# Altium footprint library ALL.PcbLib: 385 footprints (part 14 of 25)
Each footprint in its own frame and in the unit in brackets; x right, y up, seen from the top. Pads: shape width x height; smd on the part's side, far side on the other; paste and mask are expansions set on the pad; w line width, h text height; cw(c..) or ccw(c..) is an arc to the next point about the centre after c.
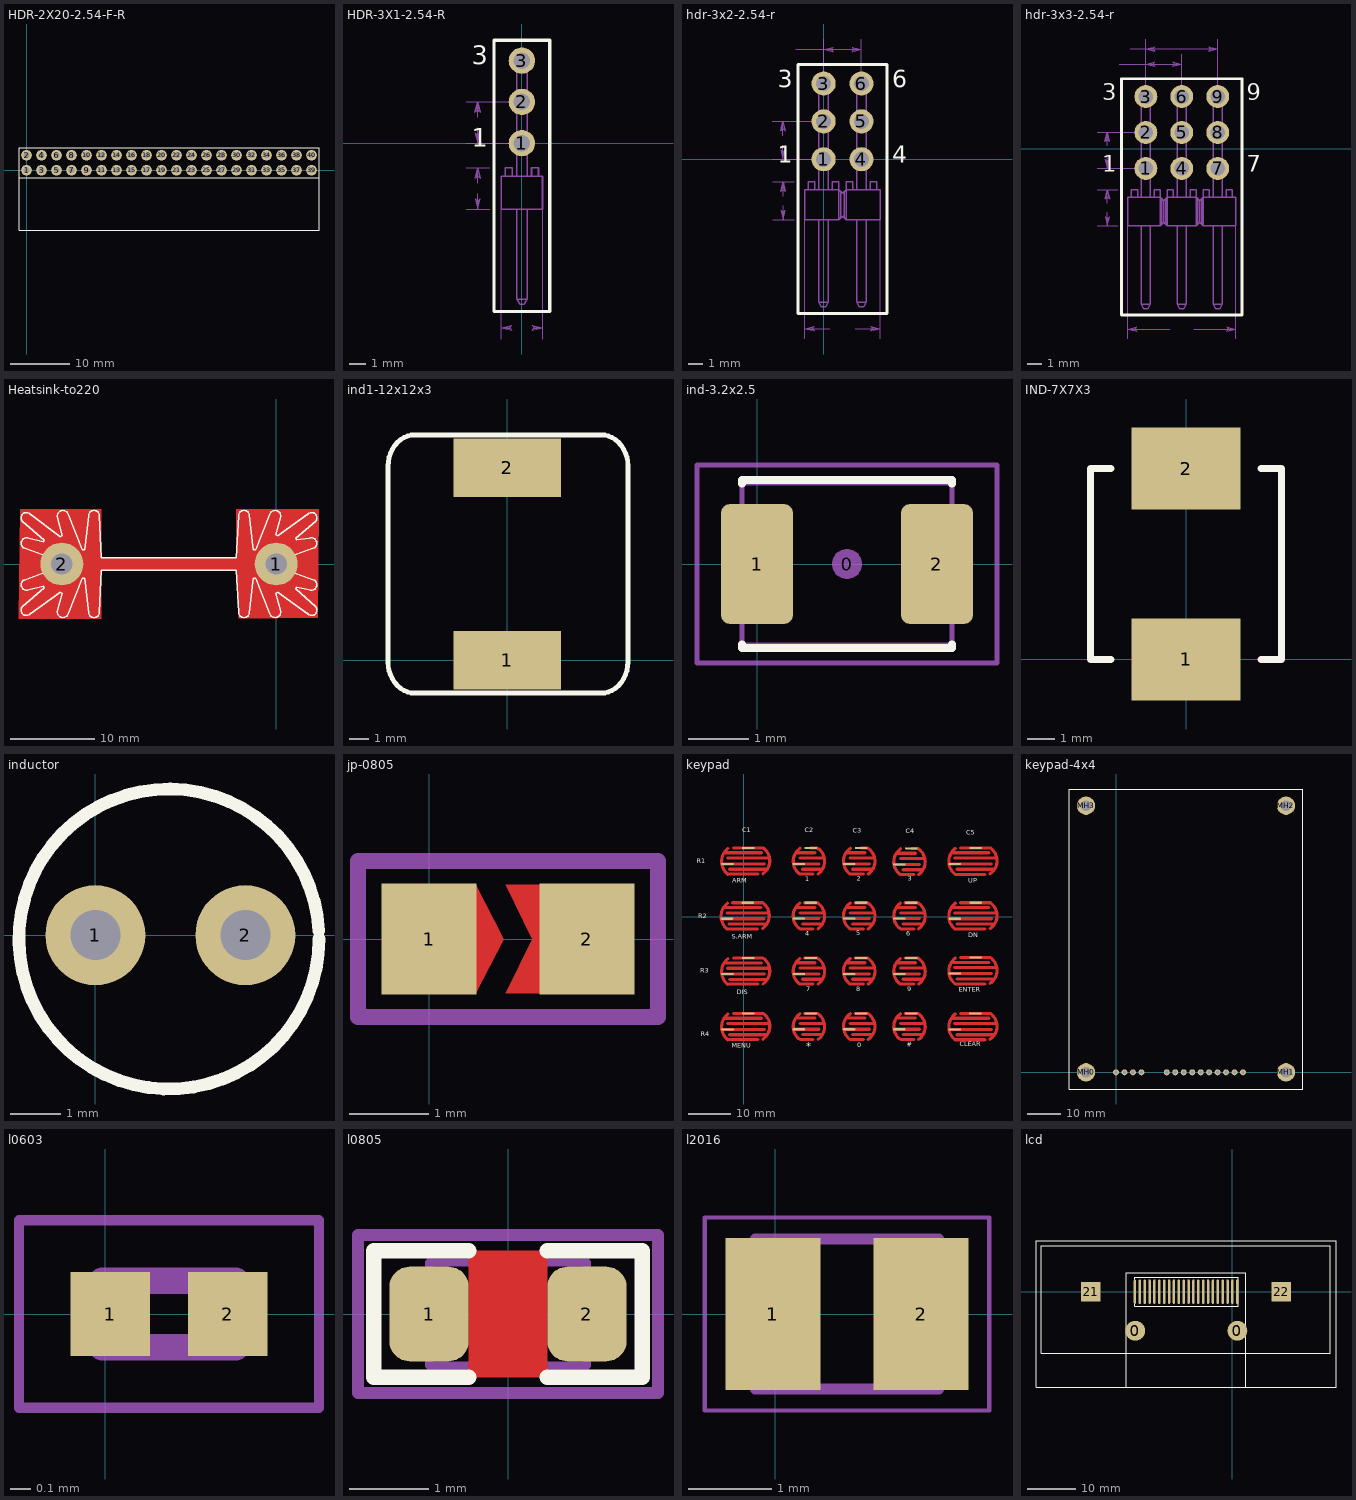
[diagram p13: the footprints below, top view; thin cyan lines are the x and y axes]

## HDR-2X20-2.54-F-R [mm]
pads (40):
  round 1.8 hole 1: 1(0,0) 2(0,2.54) 3(2.54,0) 4(2.54,2.54) 5(5.08,0) 6(5.08,2.54) 7(7.62,0) 8(7.62,2.54) 9(10.16,0) 10(10.16,2.54) 11(12.7,0) 12(12.7,2.54) 13(15.24,0) 14(15.24,2.54) 15(17.78,0) 16(17.78,2.54) 17(20.32,0) 18(20.32,2.54) 19(22.86,0) 20(22.86,2.54) 21(25.4,0) 22(25.4,2.54) 23(27.94,0) 24(27.94,2.54) 25(30.48,0) 26(30.48,2.54) 27(33.02,0) 28(33.02,2.54) 29(35.56,0) 30(35.56,2.54) 31(38.1,0) 32(38.1,2.54) 33(40.64,0) 34(40.64,2.54) 35(43.18,0) 36(43.18,2.54) 37(45.72,0) 38(45.72,2.54) 39(48.26,0) 40(48.26,2.54)
Top Overlay:
  lines w0.2: -1.27,-1.27 -1.27,3.81 49.53,3.81 49.53,-1.27 ; -1.27,-1.27 49.53,-1.27 ; -1.27,-1.27 -1.27,-10.16 49.53,-10.16 49.53,-1.27
3D body "PBD-40R.step": height 5, standoff -3, extent -1.27,-10.16 49.53,2.84

## HDR-3X1-2.54-R [mm]
pads (3):
  round 1.62 / inner round 1.524 / far side round 1.62 hole 1.02: 1(0,0) 2(0,2.54) 3(0,5.08)
Top Overlay:
  lines w0.2: -1.72,-10.356 -1.72,6.341 1.72,6.341 1.72,-10.356 -1.72,-10.356
  text "1" at -3.09,-0.635 h1.97
  text "3" at -3.09,4.445 h1.97
Top Solder:
  circle w0: c0,5.08 r0.861
  circle w0: c0,2.54 r0.861
  circle w0: c0,0 r0.861
Bottom Solder:
  circle w0: c0,5.08 r0.861
  circle w0: c0,2.54 r0.861
  circle w0: c0,0 r0.861
Mechanical 3:
  lines w0.1: -1.016,-2.032 1.018,-2.032 ; -1.016,-2.032 -1.27,-2.032 -1.27,-3.81 -1.27,-4.064 -1.016,-4.064 -0.318,-4.064 ; -1.016,-2.032 -1.016,-1.524 -0.587,-1.524 -0.587,-2.032 -0.318,-2.032 -0.318,5.398 0.318,5.398 0.318,-2.032 0.587,-2.032 0.587,-1.524 1.019,-1.524 1.018,-2.032 ; -0.318,-9.601 0.318,-9.601 ; -0.318,-9.601 -0.142,-9.906 0.142,-9.906 0.318,-9.601 ; -0.318,-9.601 -0.318,-4.064 ; -0.318,-4.064 0.318,-4.064 ; 0.318,-9.601 0.318,-4.064 ; 0.318,-4.064 1.27,-4.064 1.27,-2.032 1.018,-2.032
  text "3" at -3.09,4.445 h1.97
  text "1" at -3.09,-0.635 h1.97
Mechanical 30:
  lines w0: -3.432,0 -0.701,0 ; -3.432,2.54 -0.701,2.54 ; -3.416,-4.064 -1.971,-4.064 ; -3.416,-1.524 -1.971,-1.524 ; -2.73,0.952 -2.73,0 ; -2.73,1.588 -2.73,2.54 ; -2.715,-3.112 -2.715,-4.064 ; -2.715,-2.476 -2.715,-1.524 ; -1.27,-12.055 -1.27,-2.225 ; -0.851,-11.354 -1.27,-11.354 ; 0.851,-11.354 1.27,-11.354 ; 1.27,-12.055 1.27,-2.225 ; -2.889,0.635 -2.81,0.572 -2.73,0 ; -2.889,0.635 -2.73,0.508 ; -2.889,0.635 -2.73,0 ; -2.874,-3.429 -2.795,-3.492 -2.715,-4.064 ; -2.874,-3.429 -2.715,-3.556 ; -2.874,-3.429 -2.715,-4.064 ; -2.73,0 -2.73,0.508 ; -2.73,0 -2.651,0.572 -2.73,0.508 ; -2.73,0 -2.572,0.635 -2.73,0.508 ; -2.73,2.032 -2.73,2.54 ; -2.73,2.032 -2.81,1.968 -2.73,2.54 ; -2.73,2.032 -2.572,1.905 ; -2.73,2.032 -2.889,1.905 -2.73,2.54 ; -2.73,2.54 -2.651,1.968 -2.572,1.905 ; -2.73,2.54 -2.572,1.905 ; -2.715,-4.064 -2.715,-3.556 ; -2.715,-4.064 -2.636,-3.492 -2.715,-3.556 ; -2.715,-4.064 -2.557,-3.429 -2.715,-3.556 ; -2.715,-2.032 -2.715,-1.524 ; -2.715,-2.032 -2.795,-2.096 -2.715,-1.524 ; -2.715,-2.032 -2.557,-2.159 ; -2.715,-2.032 -2.874,-2.159 -2.715,-1.524 ; -2.715,-1.524 -2.636,-2.096 -2.557,-2.159 ; -2.715,-1.524 -2.557,-2.159 ; -1.27,-11.354 -0.698,-11.274 -0.635,-11.195 ; -1.27,-11.354 -0.762,-11.354 ; -1.27,-11.354 -0.698,-11.433 -0.762,-11.354 ; -1.27,-11.354 -0.635,-11.513 -0.762,-11.354 ; -1.27,-11.354 -0.635,-11.195 ; -0.762,-11.354 -0.635,-11.195 ; 0.635,-11.513 0.698,-11.433 1.27,-11.354 ; 0.635,-11.513 0.762,-11.354 ; 0.635,-11.513 1.27,-11.354 ; 0.762,-11.354 1.27,-11.354 ; 0.762,-11.354 0.698,-11.274 1.27,-11.354 ; 0.762,-11.354 0.635,-11.195 1.27,-11.354
  text "2.540" at -3.391,1.143 h0.39
  text "2.540" at -3.376,-2.921 h0.39
  text "2.540" at -0.66,-11.481 h0.39
Mechanical 32:
  lines w0.1: -1.72,-10.356 1.72,-10.356 1.72,6.341 -1.72,6.341 -1.72,-10.356
3D body "TSW-101-08-L-T-RA.stp": height 8.13, standoff -2.29, extent -1.27,-9.842 1.27,5.461

## hdr-3x2-2.54-r [mm]
pads (6):
  round 1.62 / inner round 1.524 / far side round 1.62 hole 1.02: 1(0,0) 2(0,2.54) 3(0,5.08) 4(2.54,0) 5(2.54,2.54) 6(2.54,5.08)
Top Overlay:
  lines w0.2: -1.72,-10.356 4.26,-10.356 4.26,6.341 -1.72,6.341 -1.72,-10.356
  text "3" at -3.09,4.445 h1.97
  text "1" at -3.09,-0.635 h1.97
  text "6" at 4.601,4.445 h1.97
  text "4" at 4.601,-0.635 h1.97
Top Solder:
  circle w0: c0,0 r0.861
  circle w0: c0,2.54 r0.861
  circle w0: c0,5.08 r0.861
  circle w0: c2.54,0 r0.861
  circle w0: c2.54,2.54 r0.861
  circle w0: c2.54,5.08 r0.861
Bottom Solder:
  circle w0: c0,0 r0.861
  circle w0: c0,2.54 r0.861
  circle w0: c0,5.08 r0.861
  circle w0: c2.54,0 r0.861
  circle w0: c2.54,2.54 r0.861
  circle w0: c2.54,5.08 r0.861
Mechanical 3:
  lines w0.1: 1.14,-3.94 1.14,-2.156 ; 1.4,-3.94 1.4,-2.156 ; -1.018,-2.032 -1.018,-1.524 -0.587,-1.524 -0.587,-2.032 -0.318,-2.032 -0.318,5.398 0.318,5.398 0.318,-2.032 0.587,-2.032 0.587,-1.524 1.016,-1.524 1.016,-2.032 ; -1.018,-2.032 -1.27,-2.032 -1.27,-4.064 -0.318,-4.064 ; -1.018,-2.032 1.016,-2.032 ; -0.318,-9.601 -0.318,-4.064 ; -0.318,-9.601 -0.142,-9.906 0.142,-9.906 0.318,-9.601 ; -0.318,-9.601 0.318,-9.601 ; -0.318,-4.064 0.318,-4.064 ; 0.318,-9.601 0.318,-4.064 ; 0.318,-4.064 1.016,-4.064 ; 1.016,-4.064 1.27,-3.81 1.524,-4.064 ; 1.016,-4.064 1.016,-2.032 ; 1.016,-2.032 1.27,-2.286 1.524,-2.032 ; 1.524,-4.064 2.222,-4.064 ; 1.524,-4.064 1.524,-2.032 ; 1.524,-2.032 1.524,-1.524 1.953,-1.524 1.953,-2.032 2.222,-2.032 2.222,5.398 2.858,5.398 2.858,-2.032 3.127,-2.032 3.127,-1.524 3.559,-1.524 3.558,-2.032 ; 1.524,-2.032 3.558,-2.032 ; 2.222,-9.601 2.222,-4.064 ; 2.222,-9.601 2.398,-9.906 2.682,-9.906 2.858,-9.601 ; 2.222,-9.601 2.858,-9.601 ; 2.222,-4.064 2.858,-4.064 ; 2.858,-9.601 2.858,-4.064 ; 2.858,-4.064 3.81,-4.064 3.81,-2.032 3.558,-2.032
  text "1" at -3.09,-0.635 h1.97
  text "3" at -3.09,4.445 h1.97
  text "4" at 4.601,-0.635 h1.97
  text "6" at 4.601,4.445 h1.97
Mechanical 30:
  lines w0: -3.432,0 -0.701,0 ; -3.432,2.54 -0.701,2.54 ; -3.416,-4.064 -1.971,-4.064 ; -3.416,-1.524 -1.971,-1.524 ; -2.73,0.952 -2.73,0 ; -2.73,1.588 -2.73,2.54 ; -2.715,-3.112 -2.715,-4.064 ; -2.715,-2.476 -2.715,-1.524 ; -1.88,7.366 0,7.366 ; -1.27,-12.055 -1.27,-2.225 ; 0,5.781 0,8.067 ; 0.419,-11.354 -1.27,-11.354 ; 2.121,-11.354 3.81,-11.354 ; 2.54,5.781 2.54,8.067 ; 3.81,-12.055 3.81,-2.225 ; -2.889,0.635 -2.73,0 ; -2.889,0.635 -2.73,0.508 ; -2.889,0.635 -2.81,0.572 -2.73,0 ; -2.874,-3.429 -2.715,-4.064 ; -2.874,-3.429 -2.715,-3.556 ; -2.874,-3.429 -2.795,-3.492 -2.715,-4.064 ; -2.73,0 -2.572,0.635 -2.73,0.508 ; -2.73,0 -2.651,0.572 -2.73,0.508 ; -2.73,0 -2.73,0.508 ; -2.73,2.032 -2.889,1.905 -2.73,2.54 ; -2.73,2.032 -2.572,1.905 ; -2.73,2.032 -2.81,1.968 -2.73,2.54 ; -2.73,2.032 -2.73,2.54 ; -2.73,2.54 -2.572,1.905 ; -2.73,2.54 -2.651,1.968 -2.572,1.905 ; -2.715,-4.064 -2.557,-3.429 -2.715,-3.556 ; -2.715,-4.064 -2.636,-3.492 -2.715,-3.556 ; -2.715,-4.064 -2.715,-3.556 ; -2.715,-2.032 -2.874,-2.159 -2.715,-1.524 ; -2.715,-2.032 -2.557,-2.159 ; -2.715,-2.032 -2.795,-2.096 -2.715,-1.524 ; -2.715,-2.032 -2.715,-1.524 ; -2.715,-1.524 -2.557,-2.159 ; -2.715,-1.524 -2.636,-2.096 -2.557,-2.159 ; -1.27,-11.354 -0.635,-11.195 ; -1.27,-11.354 -0.635,-11.513 -0.762,-11.354 ; -1.27,-11.354 -0.698,-11.433 -0.762,-11.354 ; -1.27,-11.354 -0.762,-11.354 ; -1.27,-11.354 -0.698,-11.274 -0.635,-11.195 ; -0.762,-11.354 -0.635,-11.195 ; 0,7.366 0.635,7.525 ; 0,7.366 0.635,7.207 0.508,7.366 ; 0,7.366 0.572,7.287 0.508,7.366 ; 0,7.366 0.508,7.366 ; 0,7.366 0.572,7.445 0.635,7.525 ; 0,7.366 2.54,7.366 ; 0.508,7.366 0.635,7.525 ; 1.905,7.207 2.54,7.366 ; 1.905,7.207 2.032,7.366 ; 1.905,7.207 1.968,7.287 2.54,7.366 ; 2.032,7.366 1.905,7.525 2.54,7.366 ; 2.032,7.366 1.968,7.445 2.54,7.366 ; 2.032,7.366 2.54,7.366 ; 3.175,-11.513 3.81,-11.354 ; 3.175,-11.513 3.302,-11.354 ; 3.175,-11.513 3.238,-11.433 3.81,-11.354 ; 3.302,-11.354 3.175,-11.195 3.81,-11.354 ; 3.302,-11.354 3.238,-11.274 3.81,-11.354 ; 3.302,-11.354 3.81,-11.354
  text "2.540" at -3.376,-2.921 h0.39
  text "2.540" at -3.391,1.143 h0.39
  text "2.540" at -3.391,7.239 h0.39
  text "5.080" at 0.61,-11.481 h0.39
Mechanical 32:
  lines w0.1: -1.72,-10.356 -1.72,6.341 4.26,6.341 4.26,-10.356 -1.72,-10.356
3D body "TSW-102-08-L-T-RA.stp": height 8.38, standoff -2.03, extent -1.397,-9.811 3.683,5.493

## hdr-3x3-2.54-r [mm]
pads (9):
  round 1.62 / inner round 1.524 / far side round 1.62 hole 1.02: 1(12.624,-1.397) 2(12.624,1.143) 3(12.624,3.683) 4(15.164,-1.397) 5(15.164,1.143) 6(15.164,3.683) 7(17.704,-1.397) 8(17.704,1.143) 9(17.704,3.683)
Top Overlay:
  lines w0.2: 10.904,-11.753 10.904,4.944 19.424,4.944 19.424,-11.753 10.904,-11.753
  text "1" at 9.534,-2.032 h1.97
  text "7" at 19.765,-2.032 h1.97
  text "3" at 9.534,3.048 h1.97
  text "9" at 19.765,3.048 h1.97
Top Solder:
  circle w0: c17.704,3.683 r0.861
  circle w0: c17.704,1.143 r0.861
  circle w0: c17.704,-1.397 r0.861
  circle w0: c15.164,3.683 r0.861
  circle w0: c15.164,1.143 r0.861
  circle w0: c15.164,-1.397 r0.861
  circle w0: c12.624,3.683 r0.861
  circle w0: c12.624,1.143 r0.861
  circle w0: c12.624,-1.397 r0.861
Bottom Solder:
  circle w0: c17.704,3.683 r0.861
  circle w0: c17.704,1.143 r0.861
  circle w0: c17.704,-1.397 r0.861
  circle w0: c15.164,3.683 r0.861
  circle w0: c15.164,1.143 r0.861
  circle w0: c15.164,-1.397 r0.861
  circle w0: c12.624,3.683 r0.861
  circle w0: c12.624,1.143 r0.861
  circle w0: c12.624,-1.397 r0.861
Mechanical 3:
  lines w0.1: 13.764,-5.337 13.764,-3.553 ; 14.024,-5.337 14.024,-3.553 ; 14.836,-5.461 15.482,-5.461 ; 16.304,-5.337 16.304,-3.553 ; 16.564,-5.337 16.564,-3.553 ; 11.606,-3.429 13.64,-3.429 ; 11.606,-3.429 11.354,-3.429 11.354,-5.461 12.306,-5.461 ; 11.606,-3.429 11.606,-2.921 12.037,-2.921 12.037,-3.429 12.306,-3.429 12.306,4.001 12.942,4.001 12.942,-3.429 13.211,-3.429 13.211,-2.921 13.64,-2.921 13.64,-3.429 ; 12.306,-10.998 12.942,-10.998 ; 12.306,-10.998 12.482,-11.303 12.766,-11.303 12.942,-10.998 ; 12.306,-10.998 12.306,-5.461 ; 12.306,-5.461 12.942,-5.461 ; 12.942,-10.998 12.942,-5.461 ; 12.942,-5.461 13.64,-5.461 ; 13.64,-5.461 13.64,-3.429 ; 13.64,-5.461 13.894,-5.207 ; 13.64,-3.429 13.894,-3.683 ; 13.894,-5.207 13.894,-3.683 ; 13.894,-5.207 14.148,-5.461 ; 13.894,-3.683 14.148,-3.429 ; 14.148,-5.461 14.148,-3.429 ; 14.148,-5.461 14.846,-5.461 14.846,-10.998 ; 14.148,-3.429 16.18,-3.429 ; 14.148,-3.429 14.148,-2.921 14.577,-2.921 14.577,-3.429 14.846,-3.429 14.846,4.001 15.482,4.001 15.482,-3.429 15.751,-3.429 15.751,-2.921 16.18,-2.921 16.18,-3.429 ; 14.846,-10.998 15.482,-10.998 ; 14.846,-10.998 15.022,-11.303 15.306,-11.303 15.482,-10.998 ; 15.482,-10.998 15.482,-5.461 ; 15.482,-5.461 16.18,-5.461 ; 16.18,-5.461 16.18,-3.429 ; 16.18,-5.461 16.434,-5.207 ; 16.18,-3.429 16.434,-3.683 ; 16.434,-5.207 16.688,-5.461 ; 16.434,-5.207 16.434,-3.683 ; 16.434,-3.683 16.688,-3.429 ; 16.688,-5.461 16.688,-3.429 ; 16.688,-5.461 17.386,-5.461 ; 16.688,-3.429 18.722,-3.429 ; 16.688,-3.429 16.688,-2.921 17.117,-2.921 17.117,-3.429 17.386,-3.429 17.386,4.001 18.022,4.001 18.022,-3.429 18.291,-3.429 18.291,-2.921 18.723,-2.921 18.722,-3.429 ; 17.386,-10.998 18.022,-10.998 ; 17.386,-10.998 17.562,-11.303 17.846,-11.303 18.022,-10.998 ; 17.386,-10.998 17.386,-5.461 ; 17.386,-5.461 18.022,-5.461 ; 18.022,-10.998 18.022,-5.461 ; 18.022,-5.461 18.974,-5.461 18.974,-3.429 18.722,-3.429
  text "9" at 19.765,3.048 h1.97
  text "7" at 19.765,-2.032 h1.97
  text "3" at 9.534,3.048 h1.97
  text "1" at 9.534,-2.032 h1.97
Mechanical 30:
  lines w0: 9.192,-1.397 11.923,-1.397 ; 9.192,1.143 11.923,1.143 ; 9.208,-5.461 10.653,-5.461 ; 9.208,-2.921 10.653,-2.921 ; 9.894,-0.445 9.894,-1.397 ; 9.894,0.191 9.894,1.143 ; 9.909,-4.509 9.909,-5.461 ; 9.909,-3.873 9.909,-2.921 ; 10.744,5.969 12.624,5.969 ; 11.354,-13.452 11.354,-3.622 ; 11.506,7.049 12.624,7.049 ; 12.624,6.67 12.624,4.384 12.624,7.75 ; 14.313,-12.751 11.354,-12.751 ; 15.164,4.384 15.164,6.67 ; 16.015,-12.751 18.974,-12.751 ; 17.704,4.384 17.704,7.75 ; 18.974,-13.452 18.974,-3.622 ; 9.735,-0.762 9.814,-0.825 9.894,-1.397 ; 9.735,-0.762 9.894,-0.889 ; 9.735,-0.762 9.894,-1.397 ; 9.75,-4.826 9.829,-4.889 9.909,-5.461 ; 9.75,-4.826 9.909,-4.953 ; 9.75,-4.826 9.909,-5.461 ; 9.894,-1.397 9.894,-0.889 ; 9.894,-1.397 9.973,-0.825 9.894,-0.889 ; 9.894,-1.397 10.052,-0.762 9.894,-0.889 ; 9.894,0.635 9.894,1.143 ; 9.894,0.635 9.814,0.571 9.894,1.143 ; 9.894,0.635 10.052,0.508 ; 9.894,0.635 9.735,0.508 9.894,1.143 ; 9.894,1.143 9.973,0.571 10.052,0.508 ; 9.894,1.143 10.052,0.508 ; 9.909,-5.461 9.909,-4.953 ; 9.909,-5.461 9.988,-4.889 9.909,-4.953 ; 9.909,-5.461 10.067,-4.826 9.909,-4.953 ; 9.909,-3.429 9.909,-2.921 ; 9.909,-3.429 9.829,-3.493 9.909,-2.921 ; 9.909,-3.429 10.067,-3.556 ; 9.909,-3.429 9.75,-3.556 9.909,-2.921 ; 9.909,-2.921 9.988,-3.493 10.067,-3.556 ; 9.909,-2.921 10.067,-3.556 ; 11.354,-12.751 11.926,-12.671 11.989,-12.592 ; 11.354,-12.751 11.862,-12.751 ; 11.354,-12.751 11.926,-12.83 11.862,-12.751 ; 11.354,-12.751 11.989,-12.91 11.862,-12.751 ; 11.354,-12.751 11.989,-12.592 ; 11.862,-12.751 11.989,-12.592 ; 12.624,5.969 15.164,5.969 ; 12.624,5.969 13.196,6.048 13.259,6.128 ; 12.624,5.969 13.132,5.969 ; 12.624,5.969 13.196,5.89 13.132,5.969 ; 12.624,5.969 13.259,5.81 13.132,5.969 ; 12.624,5.969 13.259,6.128 ; 12.624,7.049 17.704,7.049 ; 12.624,7.049 13.196,7.128 13.259,7.207 ; 12.624,7.049 13.132,7.049 ; 12.624,7.049 13.196,6.969 13.132,7.049 ; 12.624,7.049 13.259,6.89 13.132,7.049 ; 12.624,7.049 13.259,7.207 ; 13.132,5.969 13.259,6.128 ; 13.132,7.049 13.259,7.207 ; 14.529,5.81 14.592,5.89 15.164,5.969 ; 14.529,5.81 14.656,5.969 ; 14.529,5.81 15.164,5.969 ; 14.656,5.969 15.164,5.969 ; 14.656,5.969 14.592,6.048 15.164,5.969 ; 14.656,5.969 14.529,6.128 15.164,5.969 ; 17.069,6.89 17.132,6.969 17.704,7.049 ; 17.069,6.89 17.196,7.049 ; 17.069,6.89 17.704,7.049 ; 17.196,7.049 17.704,7.049 ; 17.196,7.049 17.132,7.128 17.704,7.049 ; 17.196,7.049 17.069,7.207 17.704,7.049 ; 18.339,-12.91 18.402,-12.83 18.974,-12.751 ; 18.339,-12.91 18.466,-12.751 ; 18.339,-12.91 18.974,-12.751 ; 18.466,-12.751 18.974,-12.751 ; 18.466,-12.751 18.402,-12.671 18.974,-12.751 ; 18.466,-12.751 18.339,-12.592 18.974,-12.751
  text "7.620" at 14.504,-12.878 h0.39
  text "5.080" at 9.995,6.921 h0.39
  text "2.540" at 9.233,5.842 h0.39
  text "2.540" at 9.233,-0.254 h0.39
  text "2.540" at 9.248,-4.318 h0.39
Mechanical 32:
  lines w0.1: 10.904,-11.753 19.424,-11.753 19.424,4.944 10.904,4.944 10.904,-11.753
3D body "TSW-103-08-L-T-RA.stp": height 8.38, standoff -2.03, extent 11.227,-11.335 18.847,3.969

## Heatsink-to220 [mm]
pads (2):
  round 5.08 hole 2.54: 1(0,0) 2(-25.4,0)
Top Layer:
  region: -30.48,-6.477 -20.701,-6.477 -20.701,-0.762 -4.699,-0.762 -4.445,-6.477 4.953,-6.35 5.08,6.477 -4.699,6.477 -4.699,0.762 -20.701,0.762 -20.701,6.477 -30.353,6.477
Top Overlay:
  lines w0.152: -29.896,1.905 -27.813,1.143 -26.289,0.635 ; -29.87,-1.905 -27.813,-1.143 -26.289,-0.635 ccw(c-25.4,0) -26.309,0.606 ; -29.855,-1.884 ccw(c-29.591,-2.464) -29.337,-3.048 -27.584,-2.616 -27.457,-2.794 -30.099,-5.08 ccw(c-29.591,-5.461) -29.083,-5.842 ; -29.855,1.884 cw(c-29.591,2.464) -29.337,3.048 -27.584,2.616 -27.457,2.794 -30.099,5.08 cw(c-29.591,5.461) -29.083,5.842 ; -29.185,-5.944 -25.578,-3.353 -25.375,-3.454 -25.959,-5.588 ; -29.185,5.944 -25.578,3.226 -25.375,3.327 -25.959,5.588 ; -25.947,-5.552 ccw(c-25.273,-5.664) -24.638,-5.918 -22.962,-1.702 -22.682,-1.702 -22.225,-5.791 ; -25.947,5.552 cw(c-25.273,5.664) -24.638,5.918 -22.962,1.702 -22.682,1.702 -22.225,5.74 ; -22.225,-5.715 ccw(c-21.59,-5.715) -20.955,-5.715 -20.701,-0.762 -4.699,-0.762 -4.445,-5.715 ccw(c-3.81,-5.715) -3.175,-5.715 ; -22.225,5.715 cw(c-21.59,5.715) -20.955,5.715 -20.701,0.762 -4.699,0.762 -4.445,5.715 cw(c-3.81,5.715) -3.175,5.715 ; -3.175,-5.766 -2.718,-1.702 -2.438,-1.702 -0.762,-5.918 ccw(c-0.127,-5.664) 0.548,-5.552 ; -3.175,5.766 -2.718,1.702 -2.438,1.702 -0.762,5.918 cw(c-0.127,5.664) 0.548,5.552 ; 0.559,-5.588 -0.025,-3.454 0.178,-3.353 3.785,-5.944 ; 0.559,5.588 -0.025,3.454 0.178,3.353 3.785,5.944 ; 3.683,-5.842 ccw(c4.191,-5.461) 4.699,-5.08 2.311,-2.921 2.438,-2.743 3.937,-3.048 ccw(c4.191,-2.464) 4.455,-1.884 ; 3.683,5.842 cw(c4.191,5.461) 4.699,5.08 2.311,3.048 2.438,2.87 3.937,3.048 cw(c4.191,2.464) 4.455,1.884 ; 4.496,-1.905 2.413,-1.143 0.889,-0.635 cw(c0,0) 0.889,0.635 2.413,1.143 4.496,1.905
Mechanical 2:
  text "2,5" at 1.905,3.048 h1.27
  text "2,5" at -24.13,3.048 h1.27
3D body "SW3dPS-HeatSink TO220.STEP": height 25, standoff -3.4, extent -30,-5.912 3.8,5.688

## ind1-12x12x3 [mm]
pads (2):
  rect 5.5x3 smd: 1(0,0) 2(0,9.906)
Top Overlay:
  lines w0.254: -6.127,-0.081 ccw(c-4.373,-0.081) -5.613,-1.321 ccw(c-4.755,-0.462) -4.755,-1.676 ; -6.121,-0.051 -6.121,8.275 ; -6.122,0.148 -6.122,0.356 ; -6.122,1.454 -6.122,9.779 -6.122,9.987 cw(c-4.368,9.987) -5.608,11.227 cw(c-4.75,10.369) -4.75,11.583 ; -4.75,-1.676 4.826,-1.676 ccw(c4.826,-0.462) 5.684,-1.321 ccw(c4.445,-0.081) 6.198,-0.081 6.198,0.127 ; -4.674,11.583 4.831,11.583 cw(c4.831,10.369) 5.69,11.227 cw(c4.45,9.987) 6.203,9.987 6.203,9.779 6.203,1.454 ; 6.198,0.076 6.198,8.707
3D body "Inductor_SMD.STEP": height 5.52, standoff 0.02, extent -6.123,-1.246 6.327,11.204

## ind-3.2x2.5 [mm]
pads (3):
  round 0.508 on Mech15: 0(1.5,0)
  rrect25% 1.2x2 smd: 1(0,0) 2(3,0)
Top Overlay:
  lines w0.127: -0.25,-1.338 -0.25,-1.4 3.25,-1.4 3.25,-1.338 ; -0.25,1.338 -0.25,1.4 3.25,1.4 3.25,1.338
Mechanical 13:
  lines w0.076: -0.25,-1.35 -0.25,1.35 3.25,1.35 3.25,-1.35 -0.25,-1.35
Mechanical 15:
  lines w0.076: -1,-1.65 -1,1.65 4,1.65 4,-1.65 -1,-1.65
3D body "INDM3225X240N.STEP": height 2.4, standoff 0, extent -0.29,-1.35 3.29,1.35

## IND-7X7X3 [mm]
pads (2):
  rect 4x3 smd: 1(0,0) 2(0,7)
Top Overlay:
  lines w0.254: -2.75,0 -3.5,0 -3.5,3.5 -3.5,7 -2.75,7 ; 2.75,0 3.5,0 3.5,3.5 3.5,7 2.75,7
3D body "Line Filter 7_3x7_3x4_2H.step": height 4.3, standoff 0.01, extent -3.65,-0.2 3.65,7.2

## inductor [mm]
pads (2):
  round 2 hole 1: 1(0,0) 2(3,0)
Top Overlay:
  lines w0.254: 4.469,0.089 ccw(c1.473,-0.076) 4.473,-0.076

## jp-0805 [mm]
pads (2):
  rect 1.2x1.4 smd: 1(0,0) 2(2,0)
Top Layer:
  region: 0.594,0.686 0.949,0 0.594,-0.686
  region: 1.584,0.686 0.975,0.686 1.305,0 0.975,-0.686 1.584,-0.686
Mechanical 15:
  lines w0.203: -0.9,-0.991 2.9,-0.991 2.9,0.991 -0.9,0.991 -0.9,-0.991

## keypad [mm]
pads (40):
  oval 3x0.5 smd: C1(0.889,3.353) C1(1.016,-23.039) C1(1.016,-9.839) C1(1.016,16.434) C2(15.938,-23.039) C2(15.938,-9.839) C2(15.938,3.361) C2(15.938,16.434) C3(27.938,-23.039) C3(27.938,-9.839) C3(27.938,3.361) C3(27.938,16.434) C4(39.939,-23.039) C4(39.939,-9.839) C4(39.939,3.361) C4(39.939,16.307) C5(55.216,-23.063) C5(55.274,-9.728) C5(55.274,3.353) C5(55.274,16.434) R1(-3.937,12.624) R1(13.081,12.624) R1(25.081,12.624) R1(37.081,12.497) R1(50.292,12.624) R2(-4.064,-0.457) R2(13.081,-0.449) R2(25.081,-0.449) R2(37.081,-0.449) R2(50.292,-0.457) R3(-3.937,-13.665) R3(13.081,-13.649) R3(25.081,-13.649) R3(37.081,-13.649) R3(50.292,-13.538) R4(-3.937,-26.873) R4(13.081,-26.849) R4(25.081,-26.849) R4(37.081,-26.849) R4(50.292,-26.873)
Top Layer:
  lines w0.75: -5.461,-0.457 -5.423,-0.457 ; -5.334,-26.873 -5.296,-26.873 ; -5.334,-13.665 -5.296,-13.665 ; -5.334,12.624 -5.296,12.624 ; -4.826,2.21 4.064,2.21 ; -4.699,-24.206 4.191,-24.206 ; -4.699,-10.998 4.191,-10.998 ; -4.699,15.291 4.191,15.291 ; -4.064,0.94 5.969,0.94 ; -3.996,-2.935 cw(c-1.552,0.122) -5.423,-0.457 ; -3.996,-2.874 3.175,-2.874 ; -3.937,-25.476 6.096,-25.476 ; -3.937,-12.268 6.096,-12.268 ; -3.937,3.226 ccw(c-1.552,0.122) -5.423,-0.457 ; -3.937,14.021 6.096,14.021 ; -3.869,-29.351 cw(c-1.425,-26.294) -5.296,-26.873 ; -3.869,-29.274 3.302,-29.274 ; -3.869,-16.143 cw(c-1.425,-13.086) -5.296,-13.665 ; -3.869,-16.074 3.302,-16.074 ; -3.869,10.146 cw(c-1.425,13.203) -5.296,12.624 ; -3.869,10.199 3.302,10.198 ; -3.81,-23.19 ccw(c-1.425,-26.294) -5.296,-26.873 ; -3.81,-9.982 ccw(c-1.425,-13.086) -5.296,-13.665 ; -3.81,16.307 ccw(c-1.425,13.203) -5.296,12.624 ; -3.556,-1.727 5.334,-1.727 ; -3.429,-28.143 5.461,-28.143 ; -3.429,-14.935 5.461,-14.935 ; -3.429,11.354 5.461,11.354 ; -2.667,3.353 0.889,3.353 4.445,3.353 cw(c2.277,0.293) 4.513,3.303 cw(c2.277,0.293) 4.386,-2.808 ; -2.54,-23.039 1.016,-23.039 4.572,-23.039 ; -2.54,-9.839 1.016,-9.839 4.572,-9.839 ; -2.54,16.434 1.016,16.434 2.992,16.434 4.572,16.434 cw(c2.404,13.374) 4.513,10.273 ; 4.513,-29.224 ccw(c2.404,-26.123) 4.572,-23.063 ; 4.513,-16.016 ccw(c2.404,-12.915) 4.572,-9.855 ; 4.699,-0.457 -4.064,-0.457 -5.423,-0.457 ; 4.826,-26.873 -3.937,-26.873 -5.296,-26.873 ; 4.826,-13.665 -3.937,-13.665 -5.296,-13.665 ; 4.826,12.624 -3.937,12.624 -5.296,12.624 ; 11.938,-26.849 13.081,-26.849 17.907,-26.849 ; 11.938,-13.649 13.081,-13.649 17.907,-13.649 ; 11.938,-0.449 13.081,-0.449 17.907,-0.449 ; 11.938,12.624 13.081,12.624 17.907,12.624 ; 12.7,-24.182 16.891,-24.182 ; 12.7,-10.982 16.891,-10.982 ; 12.7,2.218 16.891,2.218 ; 12.7,15.291 16.891,15.291 ; 13.335,-25.452 19.05,-25.452 ; 13.335,-12.252 19.05,-12.252 ; 13.335,0.948 19.05,0.948 ; 13.335,14.021 19.05,14.021 ; 13.385,-23.113 ccw(c15.494,-26.214) 13.326,-29.274 16.51,-29.274 ; 13.385,-9.913 ccw(c15.494,-13.014) 13.326,-16.074 16.51,-16.074 ; 13.385,3.287 ccw(c15.494,0.186) 13.326,-2.874 16.51,-2.874 ; 13.385,16.36 ccw(c15.494,13.259) 13.326,10.199 16.51,10.199 ; 13.97,-28.119 18.542,-28.119 ; 13.97,-14.919 18.542,-14.919 ; 13.97,-1.719 18.542,-1.719 ; 13.97,11.354 18.542,11.354 ; 14.478,-23.039 15.938,-23.039 17.575,-23.039 ; 14.478,-9.839 15.938,-9.839 17.399,-9.839 ; 14.478,3.361 15.938,3.361 17.399,3.361 ; 15.938,16.434 17.399,16.434 ; 17.574,-23.094 cw(c15.494,-26.214) 17.662,-29.274 ; 17.574,-9.894 cw(c15.494,-13.014) 17.662,-16.074 ; 17.574,3.306 cw(c15.494,0.186) 17.662,3.246 cw(c15.494,0.186) 17.662,-2.874 ; 17.574,16.379 cw(c15.494,13.259) 17.662,10.199 ; 23.938,-26.849 25.081,-26.849 29.907,-26.849 ; 23.938,-13.649 25.081,-13.649 29.907,-13.649 ; 23.938,-0.449 25.081,-0.449 29.907,-0.449 ; 23.938,12.624 25.081,12.624 29.907,12.624 ; 24.7,-24.182 28.891,-24.182 ; 24.7,-10.982 28.891,-10.982 ; 24.7,2.218 28.891,2.218 ; 24.7,15.291 28.891,15.291 ; 25.335,-25.452 31.05,-25.452 ; 25.335,-12.252 31.05,-12.252 ; 25.335,0.948 31.05,0.948 ; 25.335,14.021 31.05,14.021 ; 25.385,-23.113 ccw(c27.494,-26.214) 25.326,-29.274 28.51,-29.274 ; 25.385,-9.913 ccw(c27.494,-13.014) 25.326,-16.074 28.51,-16.074 ; 25.385,3.287 ccw(c27.494,0.186) 25.326,-2.874 28.51,-2.874 ; 25.385,16.36 ccw(c27.494,13.259) 25.326,10.199 28.51,10.199 ; 25.97,-28.119 30.542,-28.119 ; 25.97,-14.919 30.542,-14.919 ; 25.97,-1.719 30.542,-1.719 ; 25.97,11.354 30.542,11.354 ; 26.478,-23.039 27.938,-23.039 29.399,-23.039 ; 26.478,-9.839 27.938,-9.839 29.399,-9.839 ; 26.478,3.361 27.938,3.361 29.399,3.361 ; 27.938,16.434 28.359,16.434 29.399,16.434 ; 29.574,-23.094 cw(c27.494,-26.214) 29.662,-29.274 ; 29.574,-9.894 cw(c27.494,-13.014) 29.662,-16.074 ; 29.574,3.306 cw(c27.494,0.186) 29.662,3.246 cw(c27.494,0.186) 29.662,-2.874 ; 29.574,16.379 cw(c27.494,13.259) 29.662,10.199 ; 35.938,-26.849 37.081,-26.849 41.907,-26.849 ; 35.938,-13.649 37.081,-13.649 41.907,-13.649 ; 35.938,-0.449 37.081,-0.449 41.907,-0.449 ; 35.938,12.497 37.081,12.497 41.907,12.497 ; 36.7,-24.182 40.891,-24.182 ; 36.7,-10.982 40.891,-10.982 ; 36.7,2.218 40.891,2.218 ; 36.7,15.164 40.891,15.164 ; 37.335,-25.452 43.05,-25.452 ; 37.335,-12.252 43.05,-12.252 ; 37.335,0.948 43.05,0.948 ; 37.335,13.894 43.05,13.894 ; 37.385,-23.113 ccw(c39.494,-26.214) 37.338,-23.146 ccw(c39.494,-26.214) 37.326,-29.274 40.51,-29.274 ; 37.385,-9.913 ccw(c39.494,-13.014) 37.326,-16.074 40.51,-16.074 ; 37.385,3.287 ccw(c39.494,0.186) 37.338,3.254 ccw(c39.494,0.186) 37.326,-2.874 40.51,-2.874 ; 37.385,16.233 ccw(c39.494,13.132) 37.326,10.072 40.51,10.084 ; 37.97,-28.119 42.542,-28.119 ; 37.97,-14.919 42.542,-14.919 ; 37.97,-1.719 42.542,-1.719 ; 37.97,11.227 42.542,11.227 ; 38.478,-23.039 39.939,-23.039 41.399,-23.039 ; 38.478,-9.839 39.939,-9.839 41.399,-9.839 ; 38.478,3.361 39.939,3.361 41.399,3.361 ; 39.939,16.307 41.399,16.307 ; 41.574,-23.094 cw(c39.494,-26.214) 41.662,-23.154 cw(c39.494,-26.214) 41.662,-29.274 ; 41.574,-9.894 cw(c39.494,-13.014) 41.662,-16.074 ; 41.574,3.306 cw(c39.494,0.186) 41.662,3.246 cw(c39.494,0.186) 41.662,-2.874 ; 41.574,16.252 cw(c39.494,13.132) 41.662,10.072 ; 48.895,-26.873 48.933,-26.873 ; 48.895,-13.538 48.933,-13.538 ; 48.895,-0.457 48.933,-0.457 ; 48.895,12.624 48.933,12.624 ; 49.53,-24.206 58.42,-24.206 ; 49.53,-10.871 58.42,-10.871 ; 49.53,2.21 58.42,2.21 ; 49.53,15.291 58.42,15.291 ; 50.292,-25.476 60.325,-25.476 ; 50.292,-12.141 60.325,-12.141 ; 50.292,0.94 60.325,0.94 ; 50.292,14.021 60.325,14.021 ; 50.36,-16.074 57.531,-16.074 ; 50.36,-16.016 cw(c52.804,-12.959) 48.933,-13.538 ; 50.36,10.084 57.531,10.084 ; 50.36,10.146 cw(c52.804,13.203) 48.933,12.624 ; 50.419,-23.19 ccw(c52.804,-26.294) 48.933,-26.873 ; 50.419,-9.855 ccw(c52.804,-12.959) 48.933,-13.538 ; 50.419,3.226 ccw(c52.804,0.122) 48.933,-0.457 ; 50.419,16.307 ccw(c52.804,13.203) 48.933,12.624 ; 50.8,-28.143 59.69,-28.143 ; 50.8,-14.808 59.69,-14.808 ; 50.8,-1.727 59.69,-1.727 ; 50.8,11.354 59.69,11.354 ; 51.689,-23.063 55.216,-23.063 58.801,-23.063 cw(c56.633,-26.123) 58.742,-29.224 ; 51.689,-9.728 55.274,-9.728 58.801,-9.728 cw(c56.633,-12.788) 58.742,-15.889 ; 51.689,3.353 55.274,3.353 58.742,3.353 58.801,3.353 cw(c56.633,0.293) 58.742,-2.808 ; 51.689,16.434 55.274,16.434 58.076,16.434 58.801,16.434 ; 57.531,-29.351 50.36,-29.351 ; 57.531,-2.935 50.36,-2.935 ; 58.742,10.273 ccw(c56.633,13.374) 58.801,16.434 ; 58.859,16.434 58.801,16.434 ; 59.055,-26.873 50.292,-26.873 48.933,-26.873 ; 59.055,-13.538 50.292,-13.538 48.933,-13.538 ; 59.055,-0.457 50.292,-0.457 48.933,-0.457 ; 59.055,12.624 50.292,12.624 48.933,12.624 ; 48.933,-26.873 ccw(c52.804,-26.294) 50.36,-29.351 ; 48.933,-0.457 ccw(c52.804,0.122) 50.36,-2.935 ; 50.36,-29.351 50.36,-29.351 ; 50.36,-2.935 50.36,-2.935
Top Overlay:
  text "R4" at -10.316,-28.941 h2
  text "R3" at -10.414,-13.792 h2
  text "R2" at -10.922,-0.838 h2
  text "R1" at -11.216,12.259 h2
  text "C5" at 53.086,19.101 h2
  text "C4" at 38.608,19.482 h2
  text "C3" at 25.908,19.609 h2
  text "C2" at 14.478,19.736 h2
  text "C1" at -0.381,19.736 h2
  text "ARM" at -2.794,7.671 h2
  text "S.ARM" at -2.921,-5.664 h2
  text "DIS" at -1.778,-18.999 h2
  text "UP" at 53.467,7.671 h2
  text "DN" at 53.467,-5.41 h2
  text "ENTER" at 51.308,-18.364 h2
  text "CLEAR" at 51.534,-31.341 h2
  text "1" at 14.605,8.052 h2
  text "2" at 26.924,8.179 h2
  text "3" at 39.116,8.179 h2
  text "4" at 14.605,-5.029 h2
  text "5" at 26.797,-4.902 h2
  text "6" at 38.735,-5.029 h2
  text "7" at 14.859,-18.237 h2
  text "8" at 26.797,-18.237 h2
  text "9" at 38.989,-18.237 h2
  text "*" at 14.859,-32.334 h3
  text "0" at 27.051,-31.572 h2
  text "#" at 38.862,-31.445 h2
  text "MENU" at -2.921,-31.699 h2
Top Solder:
  drawing of 160 lines, arcs and shapes, not listed
3D body: height 7, standoff 0, extent -5.842,9.449 6.604,17.069
3D body: height 7, standoff 0, extent 48.26,9.449 60.706,17.069
3D body: height 7, standoff 0, extent -5.842,-3.632 6.604,3.988
3D body: height 7, standoff 0, extent 48.26,-3.632 60.706,3.988
3D body: height 7, standoff 0, extent -5.715,-16.713 6.731,-9.093
3D body: height 7, standoff 0, extent 48.387,-16.713 60.833,-9.093
3D body: height 7, standoff 0, extent -5.715,-30.048 6.731,-22.428
3D body: height 7, standoff 0, extent 48.387,-30.048 60.833,-22.428
3D body: height 7, standoff 0, extent 11.049,9.576 19.939,17.069
3D body: height 7, standoff 0, extent 23.241,9.576 32.131,17.069
3D body: height 7, standoff 0, extent 35.179,9.449 44.069,16.942
3D body: height 7, standoff 0, extent 10.922,-3.378 19.812,4.115
3D body: height 7, standoff 0, extent 23.114,-3.378 32.004,4.115
3D body: height 7, standoff 0, extent 35.052,-3.505 43.942,3.988
3D body: height 7, standoff 0, extent 10.922,-16.586 19.812,-9.093
3D body: height 7, standoff 0, extent 23.114,-16.586 32.004,-9.093
3D body: height 7, standoff 0, extent 35.052,-16.713 43.942,-9.22
3D body: height 7, standoff 0, extent 10.541,-29.794 19.431,-22.301
3D body: height 7, standoff 0, extent 22.733,-29.794 31.623,-22.301
3D body: height 7, standoff 0, extent 34.671,-29.921 43.561,-22.428
3D body: height 0.25, standoff 0, extent -6.35,-31.445 61.214,18.974

## keypad-4x4 [mil]
pads (18):
  round 70 hole 40: 1(0,0) 2(100,0) 3(200,0) 4(300,0) 5(700,0) 6(800,0) 7(900,0) 8(1000,0) 9(600,0) 10(1100,0) 11(1200,0) 12(1300,0) 13(1400,0) 14(1500,0)
  round 216.54 hole 125.98: MH0(-354.33,0) MH1(2007.87,0) MH2(2007.87,3149.61) MH3(-354.33,3149.61)
Top Overlay:
  lines w10: -551.18,-196.85 2204.72,-196.85 2204.72,3346.46 -551.18,3346.46 -551.18,-196.85
3D body "Keyboard.STEP": height 874.82, standoff 590.55, extent -551.18,-196.85 2204.72,3346.46
3D body "Spacer.STEP": height 590.55, standoff -196.85, extent 1895.36,3052.17 2120.39,3247.05
3D body "Spacer.STEP": height 590.55, standoff -196.85, extent 1895.36,-97.44 2120.39,97.44
3D body "Spacer.STEP": height 590.55, standoff -196.85, extent -466.84,-97.44 -241.81,97.44
3D body "Spacer.STEP": height 590.55, standoff -196.85, extent -466.85,3052.16 -241.82,3247.05
3D body "header10-15mm.STEP": height 710, standoff -100, extent 550,-50 1550,50
3D body "header04-15mm.STEP": height 710, standoff -100, extent -50,-50 350,50

## l0603 [mm]
pads (2):
  rect 0.38x0.4 smd: 1(0.024,0) 2(0.586,0)
Mechanical 13:
  lines w0.127: -0.015,-0.16 0.625,-0.16 0.625,0.16 -0.015,0.16 -0.015,-0.16
Mechanical 15:
  lines w0.05: -0.413,-0.448 1.023,-0.448 1.023,0.448 -0.413,0.448 -0.413,-0.448
3D body "HKQ0603W3N8C-T.STEP": height 0.33, standoff 0, extent 0.005,-0.15 0.605,0.15

## l0805 [mm]
pads (2):
  rrect50% 1x1.2 smd mask+0.075: 1(-1,0) 2(1,0)
Top Layer:
  pour cut-out: -0.5,0.8 0.5,0.8 0.5,-0.8 -0.5,-0.8
Top Overlay:
  lines w0.2: -0.5,-0.8 -1.7,-0.8 -1.7,0.8 -0.5,0.8 ; 0.5,-0.8 1.7,-0.8 1.7,0.8 0.5,0.8
Mechanical 13:
  lines w0.1: -1,-0.65 -1,0.65 1,0.65 1,-0.65 -1,-0.65
Mechanical 15:
  lines w0.15: -0.2,0 0.2,0 ; 0,-0.2 0,0.2 ; -1.9,-1 1.9,-1 1.9,1 -1.9,1 -1.9,-1
3D body "User Library-ind_0805.step": height 0.95, standoff 0, extent -1,-0.6 1,0.6

## l2016 [mm]
pads (2):
  rect 1.14x1.82 smd: 1(-0.026,0) 2(1.754,0)
Mechanical 13:
  lines w0.127: -0.236,-0.9 -0.236,0.9 1.964,0.9 1.964,-0.9 -0.236,-0.9
Mechanical 15:
  lines w0.05: -0.844,-1.158 -0.844,1.158 2.572,1.158 2.572,-1.158 -0.844,-1.158
3D body "L-M2MPNR33MGHL--3DModel-STEP-231308 (1).STEP": height 1, standoff 0, extent -0.136,-0.8 1.864,0.8

## lcd [mm]
pads (26):
  round 4.064 smd: 0(-19.939,-8.001) 0(1.016,-8.001)
  oval 0.5x5 smd: 1(-20,0) 1(0,0) 1(1,0) 2(-1,0) 3(-2,0) 4(-3,0) 5(-4,0) 6(-5,0) 7(-6,0) 8(-7,0) 9(-8,0) 10(-9,0) 11(-10,0) 12(-11,0) 13(-12,0) 14(-13,0) 15(-14,0) 16(-15,0) 17(-16,0) 18(-17,0) 19(-18,0) 20(-19,0)
  rect 4.064x4.064 smd: 21(-29.05,0) 22(10,0)
Top Overlay:
  lines w0.2: -20.07,-3 -20.07,2.97 1.2,2.97 1.2,-3 -14.735,-3 -20.07,-3
  lines w0.254: -21.775,-19.563 -21.775,3.937 -9.525,3.937 2.725,3.937 2.725,-19.563 ; -21.775,-19.563 2.725,-19.563 ; -21.775,-19.563 -40.275,-19.563 -40.275,10.437 21.225,10.437 21.225,-19.563 2.725,-19.563 ; -39.227,-12.608 -39.227,9.401 20.082,9.393 20.082,-12.608 -39.227,-12.608
3D body: height 7, standoff 0, extent -39.878,-12.71 20.701,18.786
3D body: height 4.1, standoff -4.1, extent -31.826,38.801 -31.826,38.801
3D body: height 7.1, standoff 0, extent -38.036,-8.106 18.987,18.5
3D body: height 7.1, standoff 0, extent -21.908,-12.964 2.73,-8.646